# Altium footprint library con-samtec.PCBLIB: 805 footprints (part 45 of 55)
Each footprint in its own frame and in the unit in brackets; x right, y up, seen from the top. Pads: shape width x height; smd on the part's side, far side on the other; paste and mask are expansions set on the pad; w line width, h text height; cw(c..) or ccw(c..) is an arc to the next point about the centre after c.
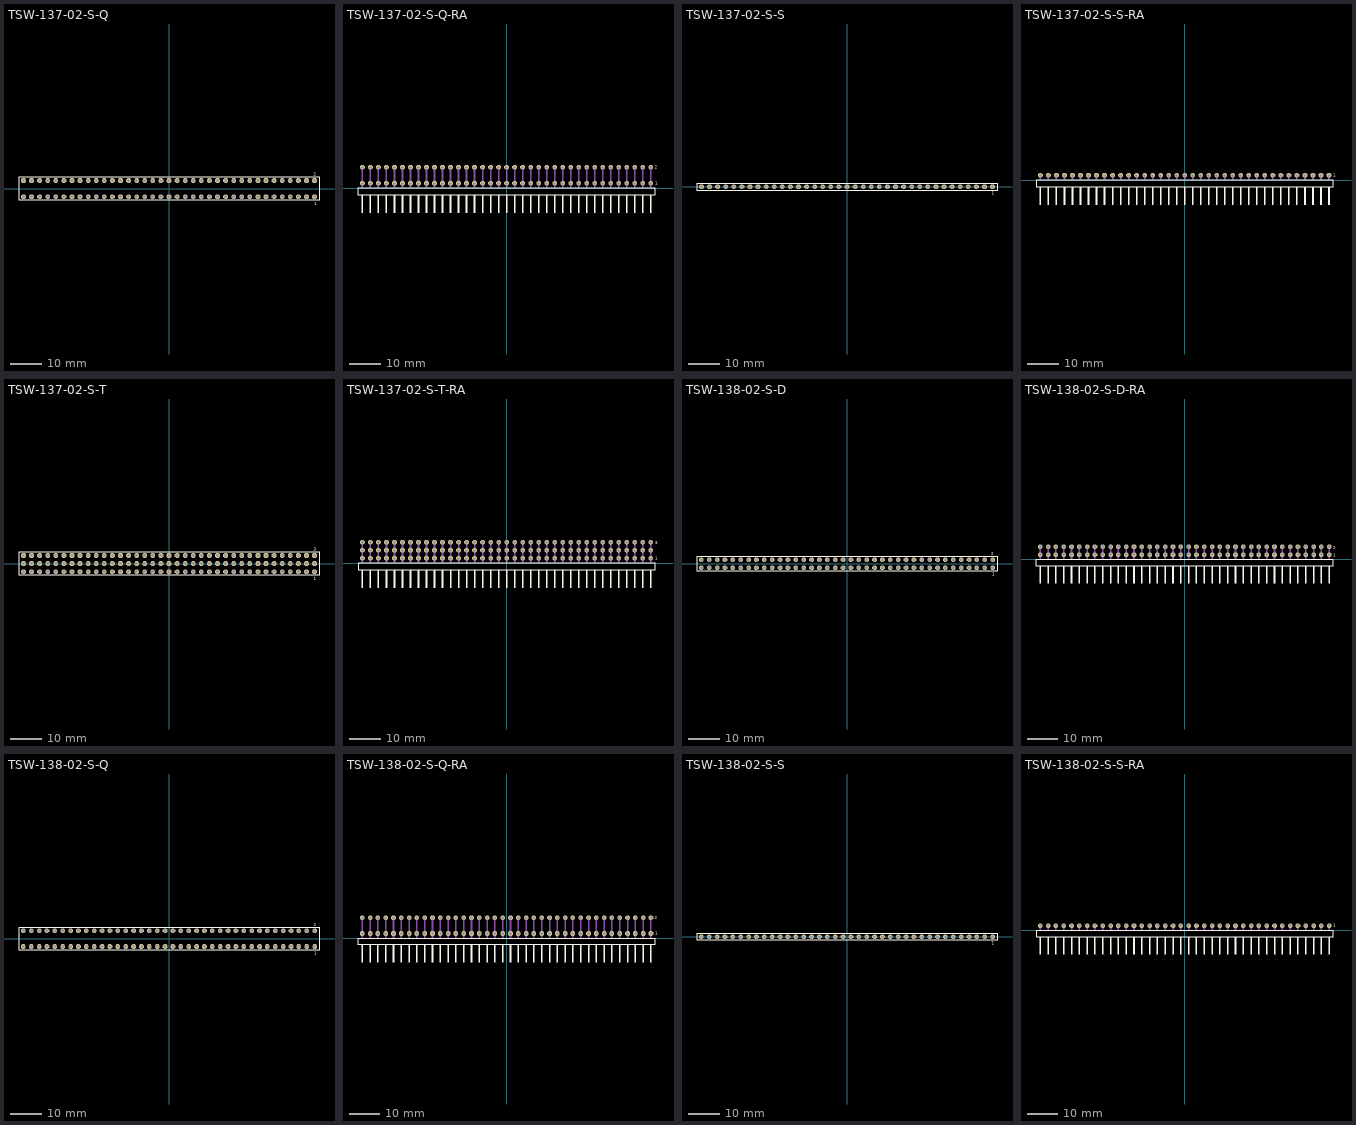
[diagram p44: the footprints below, top view; thin cyan lines are the x and y axes]

## TSW-137-02-S-Q [mm]
pads (74):
  oct 1.5x1.5 hole 1: 1(45.72,-2.54) 2(45.72,2.54) 3(43.18,-2.54) 4(43.18,2.54) 5(40.64,-2.54) 6(40.64,2.54) 7(38.1,-2.54) 8(38.1,2.54) 9(35.56,-2.54) 10(35.56,2.54) 11(33.02,-2.54) 12(33.02,2.54) 13(30.48,-2.54) 14(30.48,2.54) 15(27.94,-2.54) 16(27.94,2.54) 17(25.4,-2.54) 18(25.4,2.54) 19(22.86,-2.54) 20(22.86,2.54) 21(20.32,-2.54) 22(20.32,2.54) 23(17.78,-2.54) 24(17.78,2.54) 25(15.24,-2.54) 26(15.24,2.54) 27(12.7,-2.54) 28(12.7,2.54) 29(10.16,-2.54) 30(10.16,2.54) 31(7.62,-2.54) 32(7.62,2.54) 33(5.08,-2.54) 34(5.08,2.54) 35(2.54,-2.54) 36(2.54,2.54) 37(0,-2.54) 38(0,2.54) 39(-2.54,-2.54) 40(-2.54,2.54) 41(-5.08,-2.54) 42(-5.08,2.54) 43(-7.62,-2.54) 44(-7.62,2.54) 45(-10.16,-2.54) 46(-10.16,2.54) 47(-12.7,-2.54) 48(-12.7,2.54) 49(-15.24,-2.54) 50(-15.24,2.54) 51(-17.78,-2.54) 52(-17.78,2.54) 53(-20.32,-2.54) 54(-20.32,2.54) 55(-22.86,-2.54) 56(-22.86,2.54) 57(-25.4,-2.54) 58(-25.4,2.54) 59(-27.94,-2.54) 60(-27.94,2.54) 61(-30.48,-2.54) 62(-30.48,2.54) 63(-33.02,-2.54) 64(-33.02,2.54) 65(-35.56,-2.54) 66(-35.56,2.54) 67(-38.1,-2.54) 68(-38.1,2.54) 69(-40.64,-2.54) 70(-40.64,2.54) 71(-43.18,-2.54) 72(-43.18,2.54) 73(-45.72,-2.54) 74(-45.72,2.54)
Top Overlay:
  lines w0.203: -47.119,-3.695 47.119,-3.695 47.119,3.695 -47.119,3.695 -47.119,-3.695
  text "1" at 45.562,-5.138 h0.94
  text "2" at 45.462,3.989 h0.94
Mechanical 16:
  rectangle: -46.07,-2.89 -45.37,-2.19
  rectangle: -46.07,2.19 -45.37,2.89
  rectangle: -43.53,-2.89 -42.83,-2.19
  rectangle: -43.53,2.19 -42.83,2.89
  rectangle: -40.99,-2.89 -40.29,-2.19
  rectangle: -40.99,2.19 -40.29,2.89
  rectangle: -38.45,-2.89 -37.75,-2.19
  rectangle: -38.45,2.19 -37.75,2.89
  rectangle: -35.91,-2.89 -35.21,-2.19
  rectangle: -35.91,2.19 -35.21,2.89
  rectangle: -33.37,-2.89 -32.67,-2.19
  rectangle: -33.37,2.19 -32.67,2.89
  rectangle: -30.83,-2.89 -30.13,-2.19
  rectangle: -30.83,2.19 -30.13,2.89
  rectangle: -28.29,-2.89 -27.59,-2.19
  rectangle: -28.29,2.19 -27.59,2.89
  rectangle: -25.75,-2.89 -25.05,-2.19
  rectangle: -25.75,2.19 -25.05,2.89
  rectangle: -23.21,-2.89 -22.51,-2.19
  rectangle: -23.21,2.19 -22.51,2.89
  rectangle: -20.67,-2.89 -19.97,-2.19
  rectangle: -20.67,2.19 -19.97,2.89
  rectangle: -18.13,-2.89 -17.43,-2.19
  rectangle: -18.13,2.19 -17.43,2.89
  rectangle: -15.59,-2.89 -14.89,-2.19
  rectangle: -15.59,2.19 -14.89,2.89
  rectangle: -13.05,-2.89 -12.35,-2.19
  rectangle: -13.05,2.19 -12.35,2.89
  rectangle: -10.51,-2.89 -9.81,-2.19
  rectangle: -10.51,2.19 -9.81,2.89
  rectangle: -7.97,-2.89 -7.27,-2.19
  rectangle: -7.97,2.19 -7.27,2.89
  rectangle: -5.43,-2.89 -4.73,-2.19
  rectangle: -5.43,2.19 -4.73,2.89
  rectangle: -2.89,-2.89 -2.19,-2.19
  rectangle: -2.89,2.19 -2.19,2.89
  rectangle: -0.35,-2.89 0.35,-2.19
  rectangle: -0.35,2.19 0.35,2.89
  rectangle: 2.19,-2.89 2.89,-2.19
  rectangle: 2.19,2.19 2.89,2.89
  rectangle: 4.73,-2.89 5.43,-2.19
  rectangle: 4.73,2.19 5.43,2.89
  rectangle: 7.27,-2.89 7.97,-2.19
  rectangle: 7.27,2.19 7.97,2.89
  rectangle: 9.81,-2.89 10.51,-2.19
  rectangle: 9.81,2.19 10.51,2.89
  rectangle: 12.35,-2.89 13.05,-2.19
  rectangle: 12.35,2.19 13.05,2.89
  rectangle: 14.89,-2.89 15.59,-2.19
  rectangle: 14.89,2.19 15.59,2.89
  rectangle: 17.43,-2.89 18.13,-2.19
  rectangle: 17.43,2.19 18.13,2.89
  rectangle: 19.97,-2.89 20.67,-2.19
  rectangle: 19.97,2.19 20.67,2.89
  rectangle: 22.51,-2.89 23.21,-2.19
  rectangle: 22.51,2.19 23.21,2.89
  rectangle: 25.05,-2.89 25.75,-2.19
  rectangle: 25.05,2.19 25.75,2.89
  rectangle: 27.59,-2.89 28.29,-2.19
  rectangle: 27.59,2.19 28.29,2.89
  rectangle: 30.13,-2.89 30.83,-2.19
  rectangle: 30.13,2.19 30.83,2.89
  rectangle: 32.67,-2.89 33.37,-2.19
  rectangle: 32.67,2.19 33.37,2.89
  rectangle: 35.21,-2.89 35.91,-2.19
  rectangle: 35.21,2.19 35.91,2.89
  rectangle: 37.75,-2.89 38.45,-2.19
  rectangle: 37.75,2.19 38.45,2.89
  rectangle: 40.29,-2.89 40.99,-2.19
  rectangle: 40.29,2.19 40.99,2.89
  rectangle: 42.83,-2.89 43.53,-2.19
  rectangle: 42.83,2.19 43.53,2.89
  rectangle: 45.37,-2.89 46.07,-2.19
  rectangle: 45.37,2.19 46.07,2.89

## TSW-137-02-S-Q-RA [mil]
pads (74):
  oct 59.06x59.06 hole 39.37: 1(1800,60) 2(1800,260) 3(1700,60) 4(1700,260) 5(1600,60) 6(1600,260) 7(1500,60) 8(1500,260) 9(1400,60) 10(1400,260) 11(1300,60) 12(1300,260) 13(1200,60) 14(1200,260) 15(1100,60) 16(1100,260) 17(1000,60) 18(1000,260) 19(900,60) 20(900,260) 21(800,60) 22(800,260) 23(700,60) 24(700,260) 25(600,60) 26(600,260) 27(500,60) 28(500,260) 29(400,60) 30(400,260) 31(300,60) 32(300,260) 33(200,60) 34(200,260) 35(100,60) 36(100,260) 37(0,60) 38(0,260) 39(-100,60) 40(-100,260) 41(-200,60) 42(-200,260) 43(-300,60) 44(-300,260) 45(-400,60) 46(-400,260) 47(-500,60) 48(-500,260) 49(-600,60) 50(-600,260) 51(-700,60) 52(-700,260) 53(-800,60) 54(-800,260) 55(-900,60) 56(-900,260) 57(-1000,60) 58(-1000,260) 59(-1100,60) 60(-1100,260) 61(-1200,60) 62(-1200,260) 63(-1300,60) 64(-1300,260) 65(-1400,60) 66(-1400,260) 67(-1500,60) 68(-1500,260) 69(-1600,60) 70(-1600,260) 71(-1700,60) 72(-1700,260) 73(-1800,60) 74(-1800,260)
Top Overlay:
  rectangle: -1810,-310.63 -1790,-80.32
  rectangle: -1710,-310.63 -1690,-80.32
  rectangle: -1610,-310.63 -1590,-80.32
  rectangle: -1510,-310.63 -1490,-80.32
  rectangle: -1410,-310.63 -1390,-80.32
  rectangle: -1310,-310.63 -1290,-80.32
  rectangle: -1210,-310.63 -1190,-80.32
  rectangle: -1110,-310.63 -1090,-80.32
  rectangle: -1010,-310.63 -990,-80.32
  rectangle: -910,-310.63 -890,-80.32
  rectangle: -810,-310.63 -790,-80.32
  rectangle: -710,-310.63 -690,-80.32
  rectangle: -610,-310.63 -590,-80.32
  rectangle: -510,-310.63 -490,-80.32
  rectangle: -410,-310.63 -390,-80.32
  rectangle: -310,-310.63 -290,-80.32
  rectangle: -210,-310.63 -190,-80.32
  rectangle: -110,-310.63 -90,-80.32
  rectangle: -10,-310.63 10,-80.32
  rectangle: 90,-310.63 110,-80.32
  rectangle: 190,-310.63 210,-80.32
  rectangle: 290,-310.63 310,-80.32
  rectangle: 390,-310.63 410,-80.32
  rectangle: 490,-310.63 510,-80.32
  rectangle: 590,-310.63 610,-80.32
  rectangle: 690,-310.63 710,-80.32
  rectangle: 790,-310.63 810,-80.32
  rectangle: 890,-310.63 910,-80.32
  rectangle: 990,-310.63 1010,-80.32
  rectangle: 1090,-310.63 1110,-80.32
  rectangle: 1190,-310.63 1210,-80.32
  rectangle: 1290,-310.63 1310,-80.32
  rectangle: 1390,-310.63 1410,-80.32
  rectangle: 1490,-310.63 1510,-80.32
  rectangle: 1590,-310.63 1610,-80.32
  rectangle: 1690,-310.63 1710,-80.32
  rectangle: 1790,-310.63 1810,-80.32
  lines w8: -1855.08,-80.55 1855.08,-80.55 1855.08,-4.17 -1855.08,-4.17 -1855.08,-80.55
  text "1" at 1853.54,43.31 h36.81
  text "2" at 1851.18,242.72 h36.81
Mechanical 16:
  rectangle: -1810,0 -1790,270
  rectangle: -1710,0 -1690,270
  rectangle: -1610,0 -1590,270
  rectangle: -1510,0 -1490,270
  rectangle: -1410,0 -1390,270
  rectangle: -1310,0 -1290,270
  rectangle: -1210,0 -1190,270
  rectangle: -1110,0 -1090,270
  rectangle: -1010,0 -990,270
  rectangle: -910,0 -890,270
  rectangle: -810,0 -790,270
  rectangle: -710,0 -690,270
  rectangle: -610,0 -590,270
  rectangle: -510,0 -490,270
  rectangle: -410,0 -390,270
  rectangle: -310,0 -290,270
  rectangle: -210,0 -190,270
  rectangle: -110,0 -90,270
  rectangle: -10,0 10,270
  rectangle: 90,0 110,270
  rectangle: 190,0 210,270
  rectangle: 290,0 310,270
  rectangle: 390,0 410,270
  rectangle: 490,0 510,270
  rectangle: 590,0 610,270
  rectangle: 690,0 710,270
  rectangle: 790,0 810,270
  rectangle: 890,0 910,270
  rectangle: 990,0 1010,270
  rectangle: 1090,0 1110,270
  rectangle: 1190,0 1210,270
  rectangle: 1290,0 1310,270
  rectangle: 1390,0 1410,270
  rectangle: 1490,0 1510,270
  rectangle: 1590,0 1610,270
  rectangle: 1690,0 1710,270
  rectangle: 1790,0 1810,270

## TSW-137-02-S-S [mm]
pads (37):
  oct 1.5x1.5 hole 1: 1(45.72,0) 2(43.18,0) 3(40.64,0) 4(38.1,0) 5(35.56,0) 6(33.02,0) 7(30.48,0) 8(27.94,0) 9(25.4,0) 10(22.86,0) 11(20.32,0) 12(17.78,0) 13(15.24,0) 14(12.7,0) 15(10.16,0) 16(7.62,0) 17(5.08,0) 18(2.54,0) 19(0,0) 20(-2.54,0) 21(-5.08,0) 22(-7.62,0) 23(-10.16,0) 24(-12.7,0) 25(-15.24,0) 26(-17.78,0) 27(-20.32,0) 28(-22.86,0) 29(-25.4,0) 30(-27.94,0) 31(-30.48,0) 32(-33.02,0) 33(-35.56,0) 34(-38.1,0) 35(-40.64,0) 36(-43.18,0) 37(-45.72,0)
Top Overlay:
  lines w0.203: -47.119,-1.155 47.119,-1.155 47.119,1.155 -47.119,1.155 -47.119,-1.155
  text "1" at 45.462,-2.498 h0.94
Mechanical 16:
  rectangle: -46.07,-0.35 -45.37,0.35
  rectangle: -43.53,-0.35 -42.83,0.35
  rectangle: -40.99,-0.35 -40.29,0.35
  rectangle: -38.45,-0.35 -37.75,0.35
  rectangle: -35.91,-0.35 -35.21,0.35
  rectangle: -33.37,-0.35 -32.67,0.35
  rectangle: -30.83,-0.35 -30.13,0.35
  rectangle: -28.29,-0.35 -27.59,0.35
  rectangle: -25.75,-0.35 -25.05,0.35
  rectangle: -23.21,-0.35 -22.51,0.35
  rectangle: -20.67,-0.35 -19.97,0.35
  rectangle: -18.13,-0.35 -17.43,0.35
  rectangle: -15.59,-0.35 -14.89,0.35
  rectangle: -13.05,-0.35 -12.35,0.35
  rectangle: -10.51,-0.35 -9.81,0.35
  rectangle: -7.97,-0.35 -7.27,0.35
  rectangle: -5.43,-0.35 -4.73,0.35
  rectangle: -2.89,-0.35 -2.19,0.35
  rectangle: -0.35,-0.35 0.35,0.35
  rectangle: 2.19,-0.35 2.89,0.35
  rectangle: 4.73,-0.35 5.43,0.35
  rectangle: 7.27,-0.35 7.97,0.35
  rectangle: 9.81,-0.35 10.51,0.35
  rectangle: 12.35,-0.35 13.05,0.35
  rectangle: 14.89,-0.35 15.59,0.35
  rectangle: 17.43,-0.35 18.13,0.35
  rectangle: 19.97,-0.35 20.67,0.35
  rectangle: 22.51,-0.35 23.21,0.35
  rectangle: 25.05,-0.35 25.75,0.35
  rectangle: 27.59,-0.35 28.29,0.35
  rectangle: 30.13,-0.35 30.83,0.35
  rectangle: 32.67,-0.35 33.37,0.35
  rectangle: 35.21,-0.35 35.91,0.35
  rectangle: 37.75,-0.35 38.45,0.35
  rectangle: 40.29,-0.35 40.99,0.35
  rectangle: 42.83,-0.35 43.53,0.35
  rectangle: 45.37,-0.35 46.07,0.35

## TSW-137-02-S-S-RA [mil]
pads (37):
  oct 59.06x59.06 hole 39.37: 1(1800,60) 2(1700,60) 3(1600,60) 4(1500,60) 5(1400,60) 6(1300,60) 7(1200,60) 8(1100,60) 9(1000,60) 10(900,60) 11(800,60) 12(700,60) 13(600,60) 14(500,60) 15(400,60) 16(300,60) 17(200,60) 18(100,60) 19(0,60) 20(-100,60) 21(-200,60) 22(-300,60) 23(-400,60) 24(-500,60) 25(-600,60) 26(-700,60) 27(-800,60) 28(-900,60) 29(-1000,60) 30(-1100,60) 31(-1200,60) 32(-1300,60) 33(-1400,60) 34(-1500,60) 35(-1600,60) 36(-1700,60) 37(-1800,60)
Top Overlay:
  rectangle: -1810,-310.63 -1790,-80.32
  rectangle: -1710,-310.63 -1690,-80.32
  rectangle: -1610,-310.63 -1590,-80.32
  rectangle: -1510,-310.63 -1490,-80.32
  rectangle: -1410,-310.63 -1390,-80.32
  rectangle: -1310,-310.63 -1290,-80.32
  rectangle: -1210,-310.63 -1190,-80.32
  rectangle: -1110,-310.63 -1090,-80.32
  rectangle: -1010,-310.63 -990,-80.32
  rectangle: -910,-310.63 -890,-80.32
  rectangle: -810,-310.63 -790,-80.32
  rectangle: -710,-310.63 -690,-80.32
  rectangle: -610,-310.63 -590,-80.32
  rectangle: -510,-310.63 -490,-80.32
  rectangle: -410,-310.63 -390,-80.32
  rectangle: -310,-310.63 -290,-80.32
  rectangle: -210,-310.63 -190,-80.32
  rectangle: -110,-310.63 -90,-80.32
  rectangle: -10,-310.63 10,-80.32
  rectangle: 90,-310.63 110,-80.32
  rectangle: 190,-310.63 210,-80.32
  rectangle: 290,-310.63 310,-80.32
  rectangle: 390,-310.63 410,-80.32
  rectangle: 490,-310.63 510,-80.32
  rectangle: 590,-310.63 610,-80.32
  rectangle: 690,-310.63 710,-80.32
  rectangle: 790,-310.63 810,-80.32
  rectangle: 890,-310.63 910,-80.32
  rectangle: 990,-310.63 1010,-80.32
  rectangle: 1090,-310.63 1110,-80.32
  rectangle: 1190,-310.63 1210,-80.32
  rectangle: 1290,-310.63 1310,-80.32
  rectangle: 1390,-310.63 1410,-80.32
  rectangle: 1490,-310.63 1510,-80.32
  rectangle: 1590,-310.63 1610,-80.32
  rectangle: 1690,-310.63 1710,-80.32
  rectangle: 1790,-310.63 1810,-80.32
  lines w8: -1855.08,-80.55 1855.08,-80.55 1855.08,-4.17 -1855.08,-4.17 -1855.08,-80.55
  text "1" at 1850.47,45.35 h36.81
Mechanical 16:
  rectangle: -1810,0 -1790,70
  rectangle: -1710,0 -1690,70
  rectangle: -1610,0 -1590,70
  rectangle: -1510,0 -1490,70
  rectangle: -1410,0 -1390,70
  rectangle: -1310,0 -1290,70
  rectangle: -1210,0 -1190,70
  rectangle: -1110,0 -1090,70
  rectangle: -1010,0 -990,70
  rectangle: -910,0 -890,70
  rectangle: -810,0 -790,70
  rectangle: -710,0 -690,70
  rectangle: -610,0 -590,70
  rectangle: -510,0 -490,70
  rectangle: -410,0 -390,70
  rectangle: -310,0 -290,70
  rectangle: -210,0 -190,70
  rectangle: -110,0 -90,70
  rectangle: -10,0 10,70
  rectangle: 90,0 110,70
  rectangle: 190,0 210,70
  rectangle: 290,0 310,70
  rectangle: 390,0 410,70
  rectangle: 490,0 510,70
  rectangle: 590,0 610,70
  rectangle: 690,0 710,70
  rectangle: 790,0 810,70
  rectangle: 890,0 910,70
  rectangle: 990,0 1010,70
  rectangle: 1090,0 1110,70
  rectangle: 1190,0 1210,70
  rectangle: 1290,0 1310,70
  rectangle: 1390,0 1410,70
  rectangle: 1490,0 1510,70
  rectangle: 1590,0 1610,70
  rectangle: 1690,0 1710,70
  rectangle: 1790,0 1810,70

## TSW-137-02-S-T [mm]
pads (111):
  oct 1.5x1.5 hole 1: 1(45.72,-2.54) 2(45.72,0) 3(45.72,2.54) 4(43.18,-2.54) 5(43.18,0) 6(43.18,2.54) 7(40.64,-2.54) 8(40.64,0) 9(40.64,2.54) 10(38.1,-2.54) 11(38.1,0) 12(38.1,2.54) 13(35.56,-2.54) 14(35.56,0) 15(35.56,2.54) 16(33.02,-2.54) 17(33.02,0) 18(33.02,2.54) 19(30.48,-2.54) 20(30.48,0) 21(30.48,2.54) 22(27.94,-2.54) 23(27.94,0) 24(27.94,2.54) 25(25.4,-2.54) 26(25.4,0) 27(25.4,2.54) 28(22.86,-2.54) 29(22.86,0) 30(22.86,2.54) 31(20.32,-2.54) 32(20.32,0) 33(20.32,2.54) 34(17.78,-2.54) 35(17.78,0) 36(17.78,2.54) 37(15.24,-2.54) 38(15.24,0) 39(15.24,2.54) 40(12.7,-2.54) 41(12.7,0) 42(12.7,2.54) 43(10.16,-2.54) 44(10.16,0) 45(10.16,2.54) 46(7.62,-2.54) 47(7.62,0) 48(7.62,2.54) 49(5.08,-2.54) 50(5.08,0) 51(5.08,2.54) 52(2.54,-2.54) 53(2.54,0) 54(2.54,2.54) 55(0,-2.54) 56(0,0) 57(0,2.54) 58(-2.54,-2.54) 59(-2.54,0) 60(-2.54,2.54) 61(-5.08,-2.54) 62(-5.08,0) 63(-5.08,2.54) 64(-7.62,-2.54) 65(-7.62,0) 66(-7.62,2.54) 67(-10.16,-2.54) 68(-10.16,0) 69(-10.16,2.54) 70(-12.7,-2.54) 71(-12.7,0) 72(-12.7,2.54) 73(-15.24,-2.54) 74(-15.24,0) 75(-15.24,2.54) 76(-17.78,-2.54) 77(-17.78,0) 78(-17.78,2.54) 79(-20.32,-2.54) 80(-20.32,0) 81(-20.32,2.54) 82(-22.86,-2.54) 83(-22.86,0) 84(-22.86,2.54) 85(-25.4,-2.54) 86(-25.4,0) 87(-25.4,2.54) 88(-27.94,-2.54) 89(-27.94,0) 90(-27.94,2.54) 91(-30.48,-2.54) 92(-30.48,0) 93(-30.48,2.54) 94(-33.02,-2.54) 95(-33.02,0) 96(-33.02,2.54) 97(-35.56,-2.54) 98(-35.56,0) 99(-35.56,2.54) 100(-38.1,-2.54) 101(-38.1,0) 102(-38.1,2.54) 103(-40.64,-2.54) 104(-40.64,0) 105(-40.64,2.54) 106(-43.18,-2.54) 107(-43.18,0) 108(-43.18,2.54) 109(-45.72,-2.54) 110(-45.72,0) 111(-45.72,2.54)
Top Overlay:
  lines w0.203: -47.119,-3.695 47.119,-3.695 47.119,3.695 -47.119,3.695 -47.119,-3.695
  text "1" at 45.412,-5.188 h0.94
  text "3" at 45.408,3.989 h0.94
Mechanical 16:
  rectangle: -46.07,-2.89 -45.37,-2.19
  rectangle: -46.07,-0.35 -45.37,0.35
  rectangle: -46.07,2.19 -45.37,2.89
  rectangle: -43.53,-2.89 -42.83,-2.19
  rectangle: -43.53,-0.35 -42.83,0.35
  rectangle: -43.53,2.19 -42.83,2.89
  rectangle: -40.99,-2.89 -40.29,-2.19
  rectangle: -40.99,-0.35 -40.29,0.35
  rectangle: -40.99,2.19 -40.29,2.89
  rectangle: -38.45,-2.89 -37.75,-2.19
  rectangle: -38.45,-0.35 -37.75,0.35
  rectangle: -38.45,2.19 -37.75,2.89
  rectangle: -35.91,-2.89 -35.21,-2.19
  rectangle: -35.91,-0.35 -35.21,0.35
  rectangle: -35.91,2.19 -35.21,2.89
  rectangle: -33.37,-2.89 -32.67,-2.19
  rectangle: -33.37,-0.35 -32.67,0.35
  rectangle: -33.37,2.19 -32.67,2.89
  rectangle: -30.83,-2.89 -30.13,-2.19
  rectangle: -30.83,-0.35 -30.13,0.35
  rectangle: -30.83,2.19 -30.13,2.89
  rectangle: -28.29,-2.89 -27.59,-2.19
  rectangle: -28.29,-0.35 -27.59,0.35
  rectangle: -28.29,2.19 -27.59,2.89
  rectangle: -25.75,-2.89 -25.05,-2.19
  rectangle: -25.75,-0.35 -25.05,0.35
  rectangle: -25.75,2.19 -25.05,2.89
  rectangle: -23.21,-2.89 -22.51,-2.19
  rectangle: -23.21,-0.35 -22.51,0.35
  rectangle: -23.21,2.19 -22.51,2.89
  rectangle: -20.67,-2.89 -19.97,-2.19
  rectangle: -20.67,-0.35 -19.97,0.35
  rectangle: -20.67,2.19 -19.97,2.89
  rectangle: -18.13,-2.89 -17.43,-2.19
  rectangle: -18.13,-0.35 -17.43,0.35
  rectangle: -18.13,2.19 -17.43,2.89
  rectangle: -15.59,-2.89 -14.89,-2.19
  rectangle: -15.59,-0.35 -14.89,0.35
  rectangle: -15.59,2.19 -14.89,2.89
  rectangle: -13.05,-2.89 -12.35,-2.19
  rectangle: -13.05,-0.35 -12.35,0.35
  rectangle: -13.05,2.19 -12.35,2.89
  rectangle: -10.51,-2.89 -9.81,-2.19
  rectangle: -10.51,-0.35 -9.81,0.35
  rectangle: -10.51,2.19 -9.81,2.89
  rectangle: -7.97,-2.89 -7.27,-2.19
  rectangle: -7.97,-0.35 -7.27,0.35
  rectangle: -7.97,2.19 -7.27,2.89
  rectangle: -5.43,-2.89 -4.73,-2.19
  rectangle: -5.43,-0.35 -4.73,0.35
  rectangle: -5.43,2.19 -4.73,2.89
  rectangle: -2.89,-2.89 -2.19,-2.19
  rectangle: -2.89,-0.35 -2.19,0.35
  rectangle: -2.89,2.19 -2.19,2.89
  rectangle: -0.35,-2.89 0.35,-2.19
  rectangle: -0.35,-0.35 0.35,0.35
  rectangle: -0.35,2.19 0.35,2.89
  rectangle: 2.19,-2.89 2.89,-2.19
  rectangle: 2.19,-0.35 2.89,0.35
  rectangle: 2.19,2.19 2.89,2.89
  rectangle: 4.73,-2.89 5.43,-2.19
  rectangle: 4.73,-0.35 5.43,0.35
  rectangle: 4.73,2.19 5.43,2.89
  rectangle: 7.27,-2.89 7.97,-2.19
  rectangle: 7.27,-0.35 7.97,0.35
  rectangle: 7.27,2.19 7.97,2.89
  rectangle: 9.81,-2.89 10.51,-2.19
  rectangle: 9.81,-0.35 10.51,0.35
  rectangle: 9.81,2.19 10.51,2.89
  rectangle: 12.35,-2.89 13.05,-2.19
  rectangle: 12.35,-0.35 13.05,0.35
  rectangle: 12.35,2.19 13.05,2.89
  rectangle: 14.89,-2.89 15.59,-2.19
  rectangle: 14.89,-0.35 15.59,0.35
  rectangle: 14.89,2.19 15.59,2.89
  rectangle: 17.43,-2.89 18.13,-2.19
  rectangle: 17.43,-0.35 18.13,0.35
  rectangle: 17.43,2.19 18.13,2.89
  rectangle: 19.97,-2.89 20.67,-2.19
  rectangle: 19.97,-0.35 20.67,0.35
  rectangle: 19.97,2.19 20.67,2.89
  rectangle: 22.51,-2.89 23.21,-2.19
  rectangle: 22.51,-0.35 23.21,0.35
  rectangle: 22.51,2.19 23.21,2.89
  rectangle: 25.05,-2.89 25.75,-2.19
  rectangle: 25.05,-0.35 25.75,0.35
  rectangle: 25.05,2.19 25.75,2.89
  rectangle: 27.59,-2.89 28.29,-2.19
  rectangle: 27.59,-0.35 28.29,0.35
  rectangle: 27.59,2.19 28.29,2.89
  rectangle: 30.13,-2.89 30.83,-2.19
  rectangle: 30.13,-0.35 30.83,0.35
  rectangle: 30.13,2.19 30.83,2.89
  rectangle: 32.67,-2.89 33.37,-2.19
  rectangle: 32.67,-0.35 33.37,0.35
  rectangle: 32.67,2.19 33.37,2.89
  rectangle: 35.21,-2.89 35.91,-2.19
  rectangle: 35.21,-0.35 35.91,0.35
  rectangle: 35.21,2.19 35.91,2.89
  rectangle: 37.75,-2.89 38.45,-2.19
  rectangle: 37.75,-0.35 38.45,0.35
  rectangle: 37.75,2.19 38.45,2.89
  rectangle: 40.29,-2.89 40.99,-2.19
  rectangle: 40.29,-0.35 40.99,0.35
  rectangle: 40.29,2.19 40.99,2.89
  rectangle: 42.83,-2.89 43.53,-2.19
  rectangle: 42.83,-0.35 43.53,0.35
  rectangle: 42.83,2.19 43.53,2.89
  rectangle: 45.37,-2.89 46.07,-2.19
  rectangle: 45.37,-0.35 46.07,0.35
  rectangle: 45.37,2.19 46.07,2.89

## TSW-137-02-S-T-RA [mil]
pads (111):
  oct 59.06x59.06 hole 39.37: 1(1800,60) 2(1800,160) 3(1800,260) 4(1700,60) 5(1700,160) 6(1700,260) 7(1600,60) 8(1600,160) 9(1600,260) 10(1500,60) 11(1500,160) 12(1500,260) 13(1400,60) 14(1400,160) 15(1400,260) 16(1300,60) 17(1300,160) 18(1300,260) 19(1200,60) 20(1200,160) 21(1200,260) 22(1100,60) 23(1100,160) 24(1100,260) 25(1000,60) 26(1000,160) 27(1000,260) 28(900,60) 29(900,160) 30(900,260) 31(800,60) 32(800,160) 33(800,260) 34(700,60) 35(700,160) 36(700,260) 37(600,60) 38(600,160) 39(600,260) 40(500,60) 41(500,160) 42(500,260) 43(400,60) 44(400,160) 45(400,260) 46(300,60) 47(300,160) 48(300,260) 49(200,60) 50(200,160) 51(200,260) 52(100,60) 53(100,160) 54(100,260) 55(0,60) 56(0,160) 57(0,260) 58(-100,60) 59(-100,160) 60(-100,260) 61(-200,60) 62(-200,160) 63(-200,260) 64(-300,60) 65(-300,160) 66(-300,260) 67(-400,60) 68(-400,160) 69(-400,260) 70(-500,60) 71(-500,160) 72(-500,260) 73(-600,60) 74(-600,160) 75(-600,260) 76(-700,60) 77(-700,160) 78(-700,260) 79(-800,60) 80(-800,160) 81(-800,260) 82(-900,60) 83(-900,160) 84(-900,260) 85(-1000,60) 86(-1000,160) 87(-1000,260) 88(-1100,60) 89(-1100,160) 90(-1100,260) 91(-1200,60) 92(-1200,160) 93(-1200,260) 94(-1300,60) 95(-1300,160) 96(-1300,260) 97(-1400,60) 98(-1400,160) 99(-1400,260) 100(-1500,60) 101(-1500,160) 102(-1500,260) 103(-1600,60) 104(-1600,160) 105(-1600,260) 106(-1700,60) 107(-1700,160) 108(-1700,260) 109(-1800,60) 110(-1800,160) 111(-1800,260)
Top Overlay:
  rectangle: -1810,-310.63 -1790,-80.32
  rectangle: -1710,-310.63 -1690,-80.32
  rectangle: -1610,-310.63 -1590,-80.32
  rectangle: -1510,-310.63 -1490,-80.32
  rectangle: -1410,-310.63 -1390,-80.32
  rectangle: -1310,-310.63 -1290,-80.32
  rectangle: -1210,-310.63 -1190,-80.32
  rectangle: -1110,-310.63 -1090,-80.32
  rectangle: -1010,-310.63 -990,-80.32
  rectangle: -910,-310.63 -890,-80.32
  rectangle: -810,-310.63 -790,-80.32
  rectangle: -710,-310.63 -690,-80.32
  rectangle: -610,-310.63 -590,-80.32
  rectangle: -510,-310.63 -490,-80.32
  rectangle: -410,-310.63 -390,-80.32
  rectangle: -310,-310.63 -290,-80.32
  rectangle: -210,-310.63 -190,-80.32
  rectangle: -110,-310.63 -90,-80.32
  rectangle: -10,-310.63 10,-80.32
  rectangle: 90,-310.63 110,-80.32
  rectangle: 190,-310.63 210,-80.32
  rectangle: 290,-310.63 310,-80.32
  rectangle: 390,-310.63 410,-80.32
  rectangle: 490,-310.63 510,-80.32
  rectangle: 590,-310.63 610,-80.32
  rectangle: 690,-310.63 710,-80.32
  rectangle: 790,-310.63 810,-80.32
  rectangle: 890,-310.63 910,-80.32
  rectangle: 990,-310.63 1010,-80.32
  rectangle: 1090,-310.63 1110,-80.32
  rectangle: 1190,-310.63 1210,-80.32
  rectangle: 1290,-310.63 1310,-80.32
  rectangle: 1390,-310.63 1410,-80.32
  rectangle: 1490,-310.63 1510,-80.32
  rectangle: 1590,-310.63 1610,-80.32
  rectangle: 1690,-310.63 1710,-80.32
  rectangle: 1790,-310.63 1810,-80.32
  lines w8: -1855.08,-80.55 1855.08,-80.55 1855.08,-4.17 -1855.08,-4.17 -1855.08,-80.55
  text "1" at 1851.57,41.34 h36.81
  text "3" at 1852.17,236.81 h36.81
Mechanical 16:
  rectangle: -1810,0 -1790,270
  rectangle: -1710,0 -1690,270
  rectangle: -1610,0 -1590,270
  rectangle: -1510,0 -1490,270
  rectangle: -1410,0 -1390,270
  rectangle: -1310,0 -1290,270
  rectangle: -1210,0 -1190,270
  rectangle: -1110,0 -1090,270
  rectangle: -1010,0 -990,270
  rectangle: -910,0 -890,270
  rectangle: -810,0 -790,270
  rectangle: -710,0 -690,270
  rectangle: -610,0 -590,270
  rectangle: -510,0 -490,270
  rectangle: -410,0 -390,270
  rectangle: -310,0 -290,270
  rectangle: -210,0 -190,270
  rectangle: -110,0 -90,270
  rectangle: -10,0 10,270
  rectangle: 90,0 110,270
  rectangle: 190,0 210,270
  rectangle: 290,0 310,270
  rectangle: 390,0 410,270
  rectangle: 490,0 510,270
  rectangle: 590,0 610,270
  rectangle: 690,0 710,270
  rectangle: 790,0 810,270
  rectangle: 890,0 910,270
  rectangle: 990,0 1010,270
  rectangle: 1090,0 1110,270
  rectangle: 1190,0 1210,270
  rectangle: 1290,0 1310,270
  rectangle: 1390,0 1410,270
  rectangle: 1490,0 1510,270
  rectangle: 1590,0 1610,270
  rectangle: 1690,0 1710,270
  rectangle: 1790,0 1810,270

## TSW-138-02-S-D [mm]
pads (76):
  oct 1.5x1.5 hole 1: 1(46.99,-1.27) 2(46.99,1.27) 3(44.45,-1.27) 4(44.45,1.27) 5(41.91,-1.27) 6(41.91,1.27) 7(39.37,-1.27) 8(39.37,1.27) 9(36.83,-1.27) 10(36.83,1.27) 11(34.29,-1.27) 12(34.29,1.27) 13(31.75,-1.27) 14(31.75,1.27) 15(29.21,-1.27) 16(29.21,1.27) 17(26.67,-1.27) 18(26.67,1.27) 19(24.13,-1.27) 20(24.13,1.27) 21(21.59,-1.27) 22(21.59,1.27) 23(19.05,-1.27) 24(19.05,1.27) 25(16.51,-1.27) 26(16.51,1.27) 27(13.97,-1.27) 28(13.97,1.27) 29(11.43,-1.27) 30(11.43,1.27) 31(8.89,-1.27) 32(8.89,1.27) 33(6.35,-1.27) 34(6.35,1.27) 35(3.81,-1.27) 36(3.81,1.27) 37(1.27,-1.27) 38(1.27,1.27) 39(-1.27,-1.27) 40(-1.27,1.27) 41(-3.81,-1.27) 42(-3.81,1.27) 43(-6.35,-1.27) 44(-6.35,1.27) 45(-8.89,-1.27) 46(-8.89,1.27) 47(-11.43,-1.27) 48(-11.43,1.27) 49(-13.97,-1.27) 50(-13.97,1.27) 51(-16.51,-1.27) 52(-16.51,1.27) 53(-19.05,-1.27) 54(-19.05,1.27) 55(-21.59,-1.27) 56(-21.59,1.27) 57(-24.13,-1.27) 58(-24.13,1.27) 59(-26.67,-1.27) 60(-26.67,1.27) 61(-29.21,-1.27) 62(-29.21,1.27) 63(-31.75,-1.27) 64(-31.75,1.27) 65(-34.29,-1.27) 66(-34.29,1.27) 67(-36.83,-1.27) 68(-36.83,1.27) 69(-39.37,-1.27) 70(-39.37,1.27) 71(-41.91,-1.27) 72(-41.91,1.27) 73(-44.45,-1.27) 74(-44.45,1.27) 75(-46.99,-1.27) 76(-46.99,1.27)
Top Overlay:
  lines w0.203: -48.389,-2.425 48.389,-2.425 48.389,2.425 -48.389,2.425 -48.389,-2.425
  text "1" at 46.782,-3.818 h0.94
  text "2" at 46.607,2.744 h0.94
Mechanical 16:
  rectangle: -47.34,-1.62 -46.64,-0.92
  rectangle: -47.34,0.92 -46.64,1.62
  rectangle: -44.8,-1.62 -44.1,-0.92
  rectangle: -44.8,0.92 -44.1,1.62
  rectangle: -42.26,-1.62 -41.56,-0.92
  rectangle: -42.26,0.92 -41.56,1.62
  rectangle: -39.72,-1.62 -39.02,-0.92
  rectangle: -39.72,0.92 -39.02,1.62
  rectangle: -37.18,-1.62 -36.48,-0.92
  rectangle: -37.18,0.92 -36.48,1.62
  rectangle: -34.64,-1.62 -33.94,-0.92
  rectangle: -34.64,0.92 -33.94,1.62
  rectangle: -32.1,-1.62 -31.4,-0.92
  rectangle: -32.1,0.92 -31.4,1.62
  rectangle: -29.56,-1.62 -28.86,-0.92
  rectangle: -29.56,0.92 -28.86,1.62
  rectangle: -27.02,-1.62 -26.32,-0.92
  rectangle: -27.02,0.92 -26.32,1.62
  rectangle: -24.48,-1.62 -23.78,-0.92
  rectangle: -24.48,0.92 -23.78,1.62
  rectangle: -21.94,-1.62 -21.24,-0.92
  rectangle: -21.94,0.92 -21.24,1.62
  rectangle: -19.4,-1.62 -18.7,-0.92
  rectangle: -19.4,0.92 -18.7,1.62
  rectangle: -16.86,-1.62 -16.16,-0.92
  rectangle: -16.86,0.92 -16.16,1.62
  rectangle: -14.32,-1.62 -13.62,-0.92
  rectangle: -14.32,0.92 -13.62,1.62
  rectangle: -11.78,-1.62 -11.08,-0.92
  rectangle: -11.78,0.92 -11.08,1.62
  rectangle: -9.24,-1.62 -8.54,-0.92
  rectangle: -9.24,0.92 -8.54,1.62
  rectangle: -6.7,-1.62 -6,-0.92
  rectangle: -6.7,0.92 -6,1.62
  rectangle: -4.16,-1.62 -3.46,-0.92
  rectangle: -4.16,0.92 -3.46,1.62
  rectangle: -1.62,-1.62 -0.92,-0.92
  rectangle: -1.62,0.92 -0.92,1.62
  rectangle: 0.92,-1.62 1.62,-0.92
  rectangle: 0.92,0.92 1.62,1.62
  rectangle: 3.46,-1.62 4.16,-0.92
  rectangle: 3.46,0.92 4.16,1.62
  rectangle: 6,-1.62 6.7,-0.92
  rectangle: 6,0.92 6.7,1.62
  rectangle: 8.54,-1.62 9.24,-0.92
  rectangle: 8.54,0.92 9.24,1.62
  rectangle: 11.08,-1.62 11.78,-0.92
  rectangle: 11.08,0.92 11.78,1.62
  rectangle: 13.62,-1.62 14.32,-0.92
  rectangle: 13.62,0.92 14.32,1.62
  rectangle: 16.16,-1.62 16.86,-0.92
  rectangle: 16.16,0.92 16.86,1.62
  rectangle: 18.7,-1.62 19.4,-0.92
  rectangle: 18.7,0.92 19.4,1.62
  rectangle: 21.24,-1.62 21.94,-0.92
  rectangle: 21.24,0.92 21.94,1.62
  rectangle: 23.78,-1.62 24.48,-0.92
  rectangle: 23.78,0.92 24.48,1.62
  rectangle: 26.32,-1.62 27.02,-0.92
  rectangle: 26.32,0.92 27.02,1.62
  rectangle: 28.86,-1.62 29.56,-0.92
  rectangle: 28.86,0.92 29.56,1.62
  rectangle: 31.4,-1.62 32.1,-0.92
  rectangle: 31.4,0.92 32.1,1.62
  rectangle: 33.94,-1.62 34.64,-0.92
  rectangle: 33.94,0.92 34.64,1.62
  rectangle: 36.48,-1.62 37.18,-0.92
  rectangle: 36.48,0.92 37.18,1.62
  rectangle: 39.02,-1.62 39.72,-0.92
  rectangle: 39.02,0.92 39.72,1.62
  rectangle: 41.56,-1.62 42.26,-0.92
  rectangle: 41.56,0.92 42.26,1.62
  rectangle: 44.1,-1.62 44.8,-0.92
  rectangle: 44.1,0.92 44.8,1.62
  rectangle: 46.64,-1.62 47.34,-0.92
  rectangle: 46.64,0.92 47.34,1.62

## TSW-138-02-S-D-RA [mil]
pads (76):
  oct 59.06x59.06 hole 39.37: 1(1850,60) 2(1850,160) 3(1750,60) 4(1750,160) 5(1650,60) 6(1650,160) 7(1550,60) 8(1550,160) 9(1450,60) 10(1450,160) 11(1350,60) 12(1350,160) 13(1250,60) 14(1250,160) 15(1150,60) 16(1150,160) 17(1050,60) 18(1050,160) 19(950,60) 20(950,160) 21(850,60) 22(850,160) 23(750,60) 24(750,160) 25(650,60) 26(650,160) 27(550,60) 28(550,160) 29(450,60) 30(450,160) 31(350,60) 32(350,160) 33(250,60) 34(250,160) 35(150,60) 36(150,160) 37(50,60) 38(50,160) 39(-50,60) 40(-50,160) 41(-150,60) 42(-150,160) 43(-250,60) 44(-250,160) 45(-350,60) 46(-350,160) 47(-450,60) 48(-450,160) 49(-550,60) 50(-550,160) 51(-650,60) 52(-650,160) 53(-750,60) 54(-750,160) 55(-850,60) 56(-850,160) 57(-950,60) 58(-950,160) 59(-1050,60) 60(-1050,160) 61(-1150,60) 62(-1150,160) 63(-1250,60) 64(-1250,160) 65(-1350,60) 66(-1350,160) 67(-1450,60) 68(-1450,160) 69(-1550,60) 70(-1550,160) 71(-1650,60) 72(-1650,160) 73(-1750,60) 74(-1750,160) 75(-1850,60) 76(-1850,160)
Top Overlay:
  rectangle: -1860,-310.63 -1840,-80.32
  rectangle: -1760,-310.63 -1740,-80.32
  rectangle: -1660,-310.63 -1640,-80.32
  rectangle: -1560,-310.63 -1540,-80.32
  rectangle: -1460,-310.63 -1440,-80.32
  rectangle: -1360,-310.63 -1340,-80.32
  rectangle: -1260,-310.63 -1240,-80.32
  rectangle: -1160,-310.63 -1140,-80.32
  rectangle: -1060,-310.63 -1040,-80.32
  rectangle: -960,-310.63 -940,-80.32
  rectangle: -860,-310.63 -840,-80.32
  rectangle: -760,-310.63 -740,-80.32
  rectangle: -660,-310.63 -640,-80.32
  rectangle: -560,-310.63 -540,-80.32
  rectangle: -460,-310.63 -440,-80.32
  rectangle: -360,-310.63 -340,-80.32
  rectangle: -260,-310.63 -240,-80.32
  rectangle: -160,-310.63 -140,-80.32
  rectangle: -60,-310.63 -40,-80.32
  rectangle: 40,-310.63 60,-80.32
  rectangle: 140,-310.63 160,-80.32
  rectangle: 240,-310.63 260,-80.32
  rectangle: 340,-310.63 360,-80.32
  rectangle: 440,-310.63 460,-80.32
  rectangle: 540,-310.63 560,-80.32
  rectangle: 640,-310.63 660,-80.32
  rectangle: 740,-310.63 760,-80.32
  rectangle: 840,-310.63 860,-80.32
  rectangle: 940,-310.63 960,-80.32
  rectangle: 1040,-310.63 1060,-80.32
  rectangle: 1140,-310.63 1160,-80.32
  rectangle: 1240,-310.63 1260,-80.32
  rectangle: 1340,-310.63 1360,-80.32
  rectangle: 1440,-310.63 1460,-80.32
  rectangle: 1540,-310.63 1560,-80.32
  rectangle: 1640,-310.63 1660,-80.32
  rectangle: 1740,-310.63 1760,-80.32
  rectangle: 1840,-310.63 1860,-80.32
  lines w8: -1905.08,-80.55 1905.08,-80.55 1905.08,-4.17 -1905.08,-4.17 -1905.08,-80.55
  text "1" at 1900.59,30.51 h36.81
  text "2" at 1899.21,129.53 h36.81
Mechanical 16:
  rectangle: -1860,0 -1840,170
  rectangle: -1760,0 -1740,170
  rectangle: -1660,0 -1640,170
  rectangle: -1560,0 -1540,170
  rectangle: -1460,0 -1440,170
  rectangle: -1360,0 -1340,170
  rectangle: -1260,0 -1240,170
  rectangle: -1160,0 -1140,170
  rectangle: -1060,0 -1040,170
  rectangle: -960,0 -940,170
  rectangle: -860,0 -840,170
  rectangle: -760,0 -740,170
  rectangle: -660,0 -640,170
  rectangle: -560,0 -540,170
  rectangle: -460,0 -440,170
  rectangle: -360,0 -340,170
  rectangle: -260,0 -240,170
  rectangle: -160,0 -140,170
  rectangle: -60,0 -40,170
  rectangle: 40,0 60,170
  rectangle: 140,0 160,170
  rectangle: 240,0 260,170
  rectangle: 340,0 360,170
  rectangle: 440,0 460,170
  rectangle: 540,0 560,170
  rectangle: 640,0 660,170
  rectangle: 740,0 760,170
  rectangle: 840,0 860,170
  rectangle: 940,0 960,170
  rectangle: 1040,0 1060,170
  rectangle: 1140,0 1160,170
  rectangle: 1240,0 1260,170
  rectangle: 1340,0 1360,170
  rectangle: 1440,0 1460,170
  rectangle: 1540,0 1560,170
  rectangle: 1640,0 1660,170
  rectangle: 1740,0 1760,170
  rectangle: 1840,0 1860,170

## TSW-138-02-S-Q [mm]
pads (76):
  oct 1.5x1.5 hole 1: 1(46.99,-2.54) 2(46.99,2.54) 3(44.45,-2.54) 4(44.45,2.54) 5(41.91,-2.54) 6(41.91,2.54) 7(39.37,-2.54) 8(39.37,2.54) 9(36.83,-2.54) 10(36.83,2.54) 11(34.29,-2.54) 12(34.29,2.54) 13(31.75,-2.54) 14(31.75,2.54) 15(29.21,-2.54) 16(29.21,2.54) 17(26.67,-2.54) 18(26.67,2.54) 19(24.13,-2.54) 20(24.13,2.54) 21(21.59,-2.54) 22(21.59,2.54) 23(19.05,-2.54) 24(19.05,2.54) 25(16.51,-2.54) 26(16.51,2.54) 27(13.97,-2.54) 28(13.97,2.54) 29(11.43,-2.54) 30(11.43,2.54) 31(8.89,-2.54) 32(8.89,2.54) 33(6.35,-2.54) 34(6.35,2.54) 35(3.81,-2.54) 36(3.81,2.54) 37(1.27,-2.54) 38(1.27,2.54) 39(-1.27,-2.54) 40(-1.27,2.54) 41(-3.81,-2.54) 42(-3.81,2.54) 43(-6.35,-2.54) 44(-6.35,2.54) 45(-8.89,-2.54) 46(-8.89,2.54) 47(-11.43,-2.54) 48(-11.43,2.54) 49(-13.97,-2.54) 50(-13.97,2.54) 51(-16.51,-2.54) 52(-16.51,2.54) 53(-19.05,-2.54) 54(-19.05,2.54) 55(-21.59,-2.54) 56(-21.59,2.54) 57(-24.13,-2.54) 58(-24.13,2.54) 59(-26.67,-2.54) 60(-26.67,2.54) 61(-29.21,-2.54) 62(-29.21,2.54) 63(-31.75,-2.54) 64(-31.75,2.54) 65(-34.29,-2.54) 66(-34.29,2.54) 67(-36.83,-2.54) 68(-36.83,2.54) 69(-39.37,-2.54) 70(-39.37,2.54) 71(-41.91,-2.54) 72(-41.91,2.54) 73(-44.45,-2.54) 74(-44.45,2.54) 75(-46.99,-2.54) 76(-46.99,2.54)
Top Overlay:
  lines w0.203: -48.389,-3.695 48.389,-3.695 48.389,3.695 -48.389,3.695 -48.389,-3.695
  text "1" at 46.832,-5.138 h0.94
  text "2" at 46.732,3.989 h0.94
Mechanical 16:
  rectangle: -47.34,-2.89 -46.64,-2.19
  rectangle: -47.34,2.19 -46.64,2.89
  rectangle: -44.8,-2.89 -44.1,-2.19
  rectangle: -44.8,2.19 -44.1,2.89
  rectangle: -42.26,-2.89 -41.56,-2.19
  rectangle: -42.26,2.19 -41.56,2.89
  rectangle: -39.72,-2.89 -39.02,-2.19
  rectangle: -39.72,2.19 -39.02,2.89
  rectangle: -37.18,-2.89 -36.48,-2.19
  rectangle: -37.18,2.19 -36.48,2.89
  rectangle: -34.64,-2.89 -33.94,-2.19
  rectangle: -34.64,2.19 -33.94,2.89
  rectangle: -32.1,-2.89 -31.4,-2.19
  rectangle: -32.1,2.19 -31.4,2.89
  rectangle: -29.56,-2.89 -28.86,-2.19
  rectangle: -29.56,2.19 -28.86,2.89
  rectangle: -27.02,-2.89 -26.32,-2.19
  rectangle: -27.02,2.19 -26.32,2.89
  rectangle: -24.48,-2.89 -23.78,-2.19
  rectangle: -24.48,2.19 -23.78,2.89
  rectangle: -21.94,-2.89 -21.24,-2.19
  rectangle: -21.94,2.19 -21.24,2.89
  rectangle: -19.4,-2.89 -18.7,-2.19
  rectangle: -19.4,2.19 -18.7,2.89
  rectangle: -16.86,-2.89 -16.16,-2.19
  rectangle: -16.86,2.19 -16.16,2.89
  rectangle: -14.32,-2.89 -13.62,-2.19
  rectangle: -14.32,2.19 -13.62,2.89
  rectangle: -11.78,-2.89 -11.08,-2.19
  rectangle: -11.78,2.19 -11.08,2.89
  rectangle: -9.24,-2.89 -8.54,-2.19
  rectangle: -9.24,2.19 -8.54,2.89
  rectangle: -6.7,-2.89 -6,-2.19
  rectangle: -6.7,2.19 -6,2.89
  rectangle: -4.16,-2.89 -3.46,-2.19
  rectangle: -4.16,2.19 -3.46,2.89
  rectangle: -1.62,-2.89 -0.92,-2.19
  rectangle: -1.62,2.19 -0.92,2.89
  rectangle: 0.92,-2.89 1.62,-2.19
  rectangle: 0.92,2.19 1.62,2.89
  rectangle: 3.46,-2.89 4.16,-2.19
  rectangle: 3.46,2.19 4.16,2.89
  rectangle: 6,-2.89 6.7,-2.19
  rectangle: 6,2.19 6.7,2.89
  rectangle: 8.54,-2.89 9.24,-2.19
  rectangle: 8.54,2.19 9.24,2.89
  rectangle: 11.08,-2.89 11.78,-2.19
  rectangle: 11.08,2.19 11.78,2.89
  rectangle: 13.62,-2.89 14.32,-2.19
  rectangle: 13.62,2.19 14.32,2.89
  rectangle: 16.16,-2.89 16.86,-2.19
  rectangle: 16.16,2.19 16.86,2.89
  rectangle: 18.7,-2.89 19.4,-2.19
  rectangle: 18.7,2.19 19.4,2.89
  rectangle: 21.24,-2.89 21.94,-2.19
  rectangle: 21.24,2.19 21.94,2.89
  rectangle: 23.78,-2.89 24.48,-2.19
  rectangle: 23.78,2.19 24.48,2.89
  rectangle: 26.32,-2.89 27.02,-2.19
  rectangle: 26.32,2.19 27.02,2.89
  rectangle: 28.86,-2.89 29.56,-2.19
  rectangle: 28.86,2.19 29.56,2.89
  rectangle: 31.4,-2.89 32.1,-2.19
  rectangle: 31.4,2.19 32.1,2.89
  rectangle: 33.94,-2.89 34.64,-2.19
  rectangle: 33.94,2.19 34.64,2.89
  rectangle: 36.48,-2.89 37.18,-2.19
  rectangle: 36.48,2.19 37.18,2.89
  rectangle: 39.02,-2.89 39.72,-2.19
  rectangle: 39.02,2.19 39.72,2.89
  rectangle: 41.56,-2.89 42.26,-2.19
  rectangle: 41.56,2.19 42.26,2.89
  rectangle: 44.1,-2.89 44.8,-2.19
  rectangle: 44.1,2.19 44.8,2.89
  rectangle: 46.64,-2.89 47.34,-2.19
  rectangle: 46.64,2.19 47.34,2.89

## TSW-138-02-S-Q-RA [mil]
pads (76):
  oct 59.06x59.06 hole 39.37: 1(1850,60) 2(1850,260) 3(1750,60) 4(1750,260) 5(1650,60) 6(1650,260) 7(1550,60) 8(1550,260) 9(1450,60) 10(1450,260) 11(1350,60) 12(1350,260) 13(1250,60) 14(1250,260) 15(1150,60) 16(1150,260) 17(1050,60) 18(1050,260) 19(950,60) 20(950,260) 21(850,60) 22(850,260) 23(750,60) 24(750,260) 25(650,60) 26(650,260) 27(550,60) 28(550,260) 29(450,60) 30(450,260) 31(350,60) 32(350,260) 33(250,60) 34(250,260) 35(150,60) 36(150,260) 37(50,60) 38(50,260) 39(-50,60) 40(-50,260) 41(-150,60) 42(-150,260) 43(-250,60) 44(-250,260) 45(-350,60) 46(-350,260) 47(-450,60) 48(-450,260) 49(-550,60) 50(-550,260) 51(-650,60) 52(-650,260) 53(-750,60) 54(-750,260) 55(-850,60) 56(-850,260) 57(-950,60) 58(-950,260) 59(-1050,60) 60(-1050,260) 61(-1150,60) 62(-1150,260) 63(-1250,60) 64(-1250,260) 65(-1350,60) 66(-1350,260) 67(-1450,60) 68(-1450,260) 69(-1550,60) 70(-1550,260) 71(-1650,60) 72(-1650,260) 73(-1750,60) 74(-1750,260) 75(-1850,60) 76(-1850,260)
Top Overlay:
  rectangle: -1860,-310.63 -1840,-80.32
  rectangle: -1760,-310.63 -1740,-80.32
  rectangle: -1660,-310.63 -1640,-80.32
  rectangle: -1560,-310.63 -1540,-80.32
  rectangle: -1460,-310.63 -1440,-80.32
  rectangle: -1360,-310.63 -1340,-80.32
  rectangle: -1260,-310.63 -1240,-80.32
  rectangle: -1160,-310.63 -1140,-80.32
  rectangle: -1060,-310.63 -1040,-80.32
  rectangle: -960,-310.63 -940,-80.32
  rectangle: -860,-310.63 -840,-80.32
  rectangle: -760,-310.63 -740,-80.32
  rectangle: -660,-310.63 -640,-80.32
  rectangle: -560,-310.63 -540,-80.32
  rectangle: -460,-310.63 -440,-80.32
  rectangle: -360,-310.63 -340,-80.32
  rectangle: -260,-310.63 -240,-80.32
  rectangle: -160,-310.63 -140,-80.32
  rectangle: -60,-310.63 -40,-80.32
  rectangle: 40,-310.63 60,-80.32
  rectangle: 140,-310.63 160,-80.32
  rectangle: 240,-310.63 260,-80.32
  rectangle: 340,-310.63 360,-80.32
  rectangle: 440,-310.63 460,-80.32
  rectangle: 540,-310.63 560,-80.32
  rectangle: 640,-310.63 660,-80.32
  rectangle: 740,-310.63 760,-80.32
  rectangle: 840,-310.63 860,-80.32
  rectangle: 940,-310.63 960,-80.32
  rectangle: 1040,-310.63 1060,-80.32
  rectangle: 1140,-310.63 1160,-80.32
  rectangle: 1240,-310.63 1260,-80.32
  rectangle: 1340,-310.63 1360,-80.32
  rectangle: 1440,-310.63 1460,-80.32
  rectangle: 1540,-310.63 1560,-80.32
  rectangle: 1640,-310.63 1660,-80.32
  rectangle: 1740,-310.63 1760,-80.32
  rectangle: 1840,-310.63 1860,-80.32
  lines w8: -1905.08,-80.55 1905.08,-80.55 1905.08,-4.17 -1905.08,-4.17 -1905.08,-80.55
  text "1" at 1903.54,43.31 h36.81
  text "2" at 1901.18,242.72 h36.81
Mechanical 16:
  rectangle: -1860,0 -1840,270
  rectangle: -1760,0 -1740,270
  rectangle: -1660,0 -1640,270
  rectangle: -1560,0 -1540,270
  rectangle: -1460,0 -1440,270
  rectangle: -1360,0 -1340,270
  rectangle: -1260,0 -1240,270
  rectangle: -1160,0 -1140,270
  rectangle: -1060,0 -1040,270
  rectangle: -960,0 -940,270
  rectangle: -860,0 -840,270
  rectangle: -760,0 -740,270
  rectangle: -660,0 -640,270
  rectangle: -560,0 -540,270
  rectangle: -460,0 -440,270
  rectangle: -360,0 -340,270
  rectangle: -260,0 -240,270
  rectangle: -160,0 -140,270
  rectangle: -60,0 -40,270
  rectangle: 40,0 60,270
  rectangle: 140,0 160,270
  rectangle: 240,0 260,270
  rectangle: 340,0 360,270
  rectangle: 440,0 460,270
  rectangle: 540,0 560,270
  rectangle: 640,0 660,270
  rectangle: 740,0 760,270
  rectangle: 840,0 860,270
  rectangle: 940,0 960,270
  rectangle: 1040,0 1060,270
  rectangle: 1140,0 1160,270
  rectangle: 1240,0 1260,270
  rectangle: 1340,0 1360,270
  rectangle: 1440,0 1460,270
  rectangle: 1540,0 1560,270
  rectangle: 1640,0 1660,270
  rectangle: 1740,0 1760,270
  rectangle: 1840,0 1860,270

## TSW-138-02-S-S [mm]
pads (38):
  oct 1.5x1.5 hole 1: 1(46.99,0) 2(44.45,0) 3(41.91,0) 4(39.37,0) 5(36.83,0) 6(34.29,0) 7(31.75,0) 8(29.21,0) 9(26.67,0) 10(24.13,0) 11(21.59,0) 12(19.05,0) 13(16.51,0) 14(13.97,0) 15(11.43,0) 16(8.89,0) 17(6.35,0) 18(3.81,0) 19(1.27,0) 20(-1.27,0) 21(-3.81,0) 22(-6.35,0) 23(-8.89,0) 24(-11.43,0) 25(-13.97,0) 26(-16.51,0) 27(-19.05,0) 28(-21.59,0) 29(-24.13,0) 30(-26.67,0) 31(-29.21,0) 32(-31.75,0) 33(-34.29,0) 34(-36.83,0) 35(-39.37,0) 36(-41.91,0) 37(-44.45,0) 38(-46.99,0)
Top Overlay:
  lines w0.203: -48.389,-1.155 48.389,-1.155 48.389,1.155 -48.389,1.155 -48.389,-1.155
  text "1" at 46.732,-2.498 h0.94
Mechanical 16:
  rectangle: -47.34,-0.35 -46.64,0.35
  rectangle: -44.8,-0.35 -44.1,0.35
  rectangle: -42.26,-0.35 -41.56,0.35
  rectangle: -39.72,-0.35 -39.02,0.35
  rectangle: -37.18,-0.35 -36.48,0.35
  rectangle: -34.64,-0.35 -33.94,0.35
  rectangle: -32.1,-0.35 -31.4,0.35
  rectangle: -29.56,-0.35 -28.86,0.35
  rectangle: -27.02,-0.35 -26.32,0.35
  rectangle: -24.48,-0.35 -23.78,0.35
  rectangle: -21.94,-0.35 -21.24,0.35
  rectangle: -19.4,-0.35 -18.7,0.35
  rectangle: -16.86,-0.35 -16.16,0.35
  rectangle: -14.32,-0.35 -13.62,0.35
  rectangle: -11.78,-0.35 -11.08,0.35
  rectangle: -9.24,-0.35 -8.54,0.35
  rectangle: -6.7,-0.35 -6,0.35
  rectangle: -4.16,-0.35 -3.46,0.35
  rectangle: -1.62,-0.35 -0.92,0.35
  rectangle: 0.92,-0.35 1.62,0.35
  rectangle: 3.46,-0.35 4.16,0.35
  rectangle: 6,-0.35 6.7,0.35
  rectangle: 8.54,-0.35 9.24,0.35
  rectangle: 11.08,-0.35 11.78,0.35
  rectangle: 13.62,-0.35 14.32,0.35
  rectangle: 16.16,-0.35 16.86,0.35
  rectangle: 18.7,-0.35 19.4,0.35
  rectangle: 21.24,-0.35 21.94,0.35
  rectangle: 23.78,-0.35 24.48,0.35
  rectangle: 26.32,-0.35 27.02,0.35
  rectangle: 28.86,-0.35 29.56,0.35
  rectangle: 31.4,-0.35 32.1,0.35
  rectangle: 33.94,-0.35 34.64,0.35
  rectangle: 36.48,-0.35 37.18,0.35
  rectangle: 39.02,-0.35 39.72,0.35
  rectangle: 41.56,-0.35 42.26,0.35
  rectangle: 44.1,-0.35 44.8,0.35
  rectangle: 46.64,-0.35 47.34,0.35

## TSW-138-02-S-S-RA [mil]
pads (38):
  oct 59.06x59.06 hole 39.37: 1(1850,60) 2(1750,60) 3(1650,60) 4(1550,60) 5(1450,60) 6(1350,60) 7(1250,60) 8(1150,60) 9(1050,60) 10(950,60) 11(850,60) 12(750,60) 13(650,60) 14(550,60) 15(450,60) 16(350,60) 17(250,60) 18(150,60) 19(50,60) 20(-50,60) 21(-150,60) 22(-250,60) 23(-350,60) 24(-450,60) 25(-550,60) 26(-650,60) 27(-750,60) 28(-850,60) 29(-950,60) 30(-1050,60) 31(-1150,60) 32(-1250,60) 33(-1350,60) 34(-1450,60) 35(-1550,60) 36(-1650,60) 37(-1750,60) 38(-1850,60)
Top Overlay:
  rectangle: -1860,-310.63 -1840,-80.32
  rectangle: -1760,-310.63 -1740,-80.32
  rectangle: -1660,-310.63 -1640,-80.32
  rectangle: -1560,-310.63 -1540,-80.32
  rectangle: -1460,-310.63 -1440,-80.32
  rectangle: -1360,-310.63 -1340,-80.32
  rectangle: -1260,-310.63 -1240,-80.32
  rectangle: -1160,-310.63 -1140,-80.32
  rectangle: -1060,-310.63 -1040,-80.32
  rectangle: -960,-310.63 -940,-80.32
  rectangle: -860,-310.63 -840,-80.32
  rectangle: -760,-310.63 -740,-80.32
  rectangle: -660,-310.63 -640,-80.32
  rectangle: -560,-310.63 -540,-80.32
  rectangle: -460,-310.63 -440,-80.32
  rectangle: -360,-310.63 -340,-80.32
  rectangle: -260,-310.63 -240,-80.32
  rectangle: -160,-310.63 -140,-80.32
  rectangle: -60,-310.63 -40,-80.32
  rectangle: 40,-310.63 60,-80.32
  rectangle: 140,-310.63 160,-80.32
  rectangle: 240,-310.63 260,-80.32
  rectangle: 340,-310.63 360,-80.32
  rectangle: 440,-310.63 460,-80.32
  rectangle: 540,-310.63 560,-80.32
  rectangle: 640,-310.63 660,-80.32
  rectangle: 740,-310.63 760,-80.32
  rectangle: 840,-310.63 860,-80.32
  rectangle: 940,-310.63 960,-80.32
  rectangle: 1040,-310.63 1060,-80.32
  rectangle: 1140,-310.63 1160,-80.32
  rectangle: 1240,-310.63 1260,-80.32
  rectangle: 1340,-310.63 1360,-80.32
  rectangle: 1440,-310.63 1460,-80.32
  rectangle: 1540,-310.63 1560,-80.32
  rectangle: 1640,-310.63 1660,-80.32
  rectangle: 1740,-310.63 1760,-80.32
  rectangle: 1840,-310.63 1860,-80.32
  lines w8: -1905.08,-80.55 1905.08,-80.55 1905.08,-4.17 -1905.08,-4.17 -1905.08,-80.55
  text "1" at 1900.47,45.35 h36.81
Mechanical 16:
  rectangle: -1860,0 -1840,70
  rectangle: -1760,0 -1740,70
  rectangle: -1660,0 -1640,70
  rectangle: -1560,0 -1540,70
  rectangle: -1460,0 -1440,70
  rectangle: -1360,0 -1340,70
  rectangle: -1260,0 -1240,70
  rectangle: -1160,0 -1140,70
  rectangle: -1060,0 -1040,70
  rectangle: -960,0 -940,70
  rectangle: -860,0 -840,70
  rectangle: -760,0 -740,70
  rectangle: -660,0 -640,70
  rectangle: -560,0 -540,70
  rectangle: -460,0 -440,70
  rectangle: -360,0 -340,70
  rectangle: -260,0 -240,70
  rectangle: -160,0 -140,70
  rectangle: -60,0 -40,70
  rectangle: 40,0 60,70
  rectangle: 140,0 160,70
  rectangle: 240,0 260,70
  rectangle: 340,0 360,70
  rectangle: 440,0 460,70
  rectangle: 540,0 560,70
  rectangle: 640,0 660,70
  rectangle: 740,0 760,70
  rectangle: 840,0 860,70
  rectangle: 940,0 960,70
  rectangle: 1040,0 1060,70
  rectangle: 1140,0 1160,70
  rectangle: 1240,0 1260,70
  rectangle: 1340,0 1360,70
  rectangle: 1440,0 1460,70
  rectangle: 1540,0 1560,70
  rectangle: 1640,0 1660,70
  rectangle: 1740,0 1760,70
  rectangle: 1840,0 1860,70